# Altium footprint library HamedLib.PcbLib: 221 footprints (part 2 of 14)
Each footprint in its own frame and in the unit in brackets; x right, y up, seen from the top. Pads: shape width x height; smd on the part's side, far side on the other; paste and mask are expansions set on the pad; w line width, h text height; cw(c..) or ccw(c..) is an arc to the next point about the centre after c.
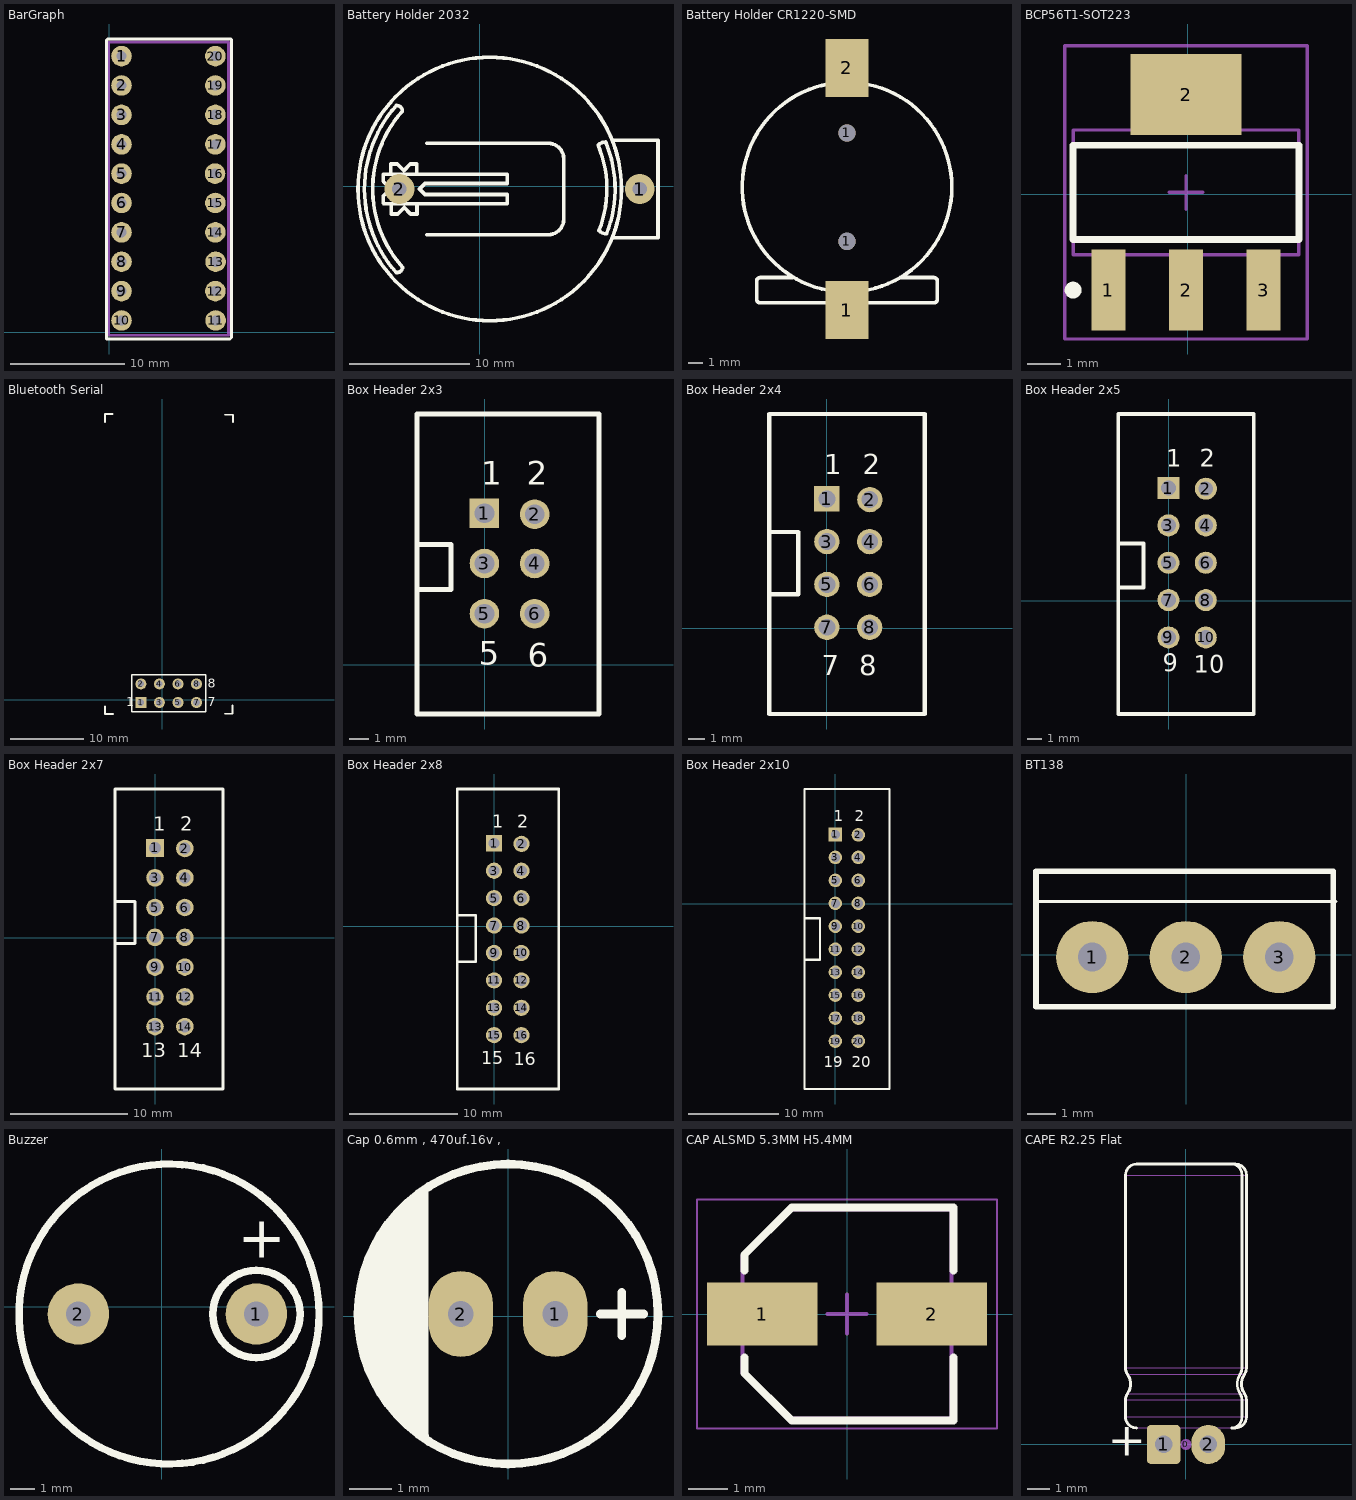
[diagram p1: the footprints below, top view; thin cyan lines are the x and y axes]

## BarGraph [mm] "LED Bar Graph"
height 10
pads (20):
  round 1.8 hole 0.9: 1(1.092,24.232) 2(1.092,21.655) 3(1.092,19.078) 4(1.092,16.485) 5(1.092,13.925) 6(1.092,11.348) 7(1.092,8.771) 8(1.092,6.195) 9(1.092,3.618) 10(1.092,1.041) 11(9.347,1.041) 12(9.322,3.618) 13(9.347,6.195) 14(9.322,8.771) 15(9.322,11.348) 16(9.296,13.925) 17(9.322,16.485) 18(9.322,19.078) 19(9.322,21.655) 20(9.322,24.232)
Top Overlay:
  lines w0.254: -0.229,-0.584 10.617,-0.584 10.744,-0.457 10.744,25.679 10.693,25.73 -0.127,25.73 -0.229,25.629 -0.229,-0.584
Mechanical 1:
  lines w0.254: -0.025,-0.254 -0.025,25.476 10.49,25.476 10.49,-0.254 -0.025,-0.254
3D body "BarGraph.STEP": height 10, standoff -3.2, extent 0.127,-0.125 10.327,25.375

## Battery Holder 2032 [mm]
pads (2):
  round 2.5 hole 1.2: 1(13.36,-0.229) 2(-6.706,-0.229)
Top Overlay:
  circle w0.305: c0.836,-0.229 r11
  lines w0.3: -6.969,6.74 ccw(c0.838,-0.229) -6.957,-7.211 ; -6.459,6.281 ccw(c0.838,-0.229) -6.447,-6.752 ; 9.881,3.429 cw(c1.168,-0.229) 9.954,-3.707 ; 10.509,3.696 cw(c1.168,-0.229) 10.584,-3.97
  lines w0.305: -7.417,1.041 -7.417,1.854 -6.877,1.854 -6.344,1.321 -6.331,1.321 -5.798,1.854 -5.258,1.854 -5.258,1.016 ; -7.391,-1.473 -7.391,-2.311 -6.852,-2.311 -6.312,-1.772 -5.772,-2.311 -5.232,-2.311 -5.232,-1.499 ; -6.918,6.74 cw(c-6.918,6.281) -6.459,6.281 ; -6.906,-7.211 ccw(c-6.906,-6.752) -6.447,-6.752 ; -4.42,-4.039 5.74,-4.039 ccw(c5.74,-2.769) 7.01,-2.769 7.01,-0.229 7.01,2.311 ccw(c5.74,2.311) 5.74,3.581 -4.42,3.581 ; 9.893,3.441 cw(c10.509,2.825) 10.509,3.696 ; 9.954,-3.707 9.956,-3.71 ccw(c10.584,-3.082) 10.584,-3.97 ; 11.074,-4.293 14.884,-4.293 14.884,3.835 11.074,3.835 ; -8.052,-1.422 -8.052,-0.813 -7.442,-0.203 -8.052,0.406 -8.052,1.016 2.286,1.016 2.286,0.229 -4.572,0.229 -5.029,-0.229 -4.572,-0.686 2.286,-0.686 2.286,-1.473 -8.001,-1.473 -8.052,-1.422
3D body "User Library-CR2032_HOR_HOLD.step": height 8.5, standoff -4, extent -10.009,-11.381 14.491,10.619

## Battery Holder CR1220-SMD [mm]
pads (4):
  rect 3x4 smd: 1(-1123.75,-1221) 2(-1123.75,-1204.25)
  round 1.2 hole 1.2: 1(-1123.75,-1216.25) 1(-1123.75,-1208.75)
Top Overlay:
  circle w0.254: c-1123.75,-1212.5 r7.25
  lines w0.254: -1127.5,-1218.75 -1129.75,-1218.75 ccw(c-1129.75,-1219) -1130,-1219 -1130,-1220.25 ccw(c-1129.75,-1220.25) -1129.75,-1220.5 -1117.75,-1220.5 ccw(c-1117.75,-1220.25) -1117.5,-1220.25 -1117.5,-1219 ccw(c-1117.75,-1219) -1117.75,-1218.75 -1120,-1218.75
3D body "User Library-Battery Holder for CR1220 SMD.step": height 4.53, standoff -0.22, extent -1131.131,-1222.092 -1116.382,-1203.292

## BCP56T1-SOT223 [mm]
pads (4):
  rect 1x2.4 smd: 1(-2.35,-2.85) 2(-0.05,-2.85) 3(2.25,-2.85)
  rect 3.3x2.4 smd: 2(-0.05,2.95)
Top Overlay:
  circle w0.25: c-3.4,-2.85 r0.125
  lines w0.2: -3.4,-1.35 -3.4,1.45 3.3,1.45 3.3,-1.35 -3.4,-1.35
Mechanical 13:
  lines w0.1: -3.4,-1.8 -3.4,1.9 3.3,1.9 3.3,-1.8 -3.4,-1.8
Mechanical 15:
  lines w0.1: -0.55,0.05 0.45,0.05 ; -0.05,-0.45 -0.05,0.55 ; -3.65,-4.3 -3.65,4.4 3.55,4.4 3.55,-4.3 -3.65,-4.3
3D body "TO-223.STEP": height 1.64, standoff -0.04, extent -3.292,-3.44 3.192,3.54

## Bluetooth Serial [mm]
pads (8):
  rect 1.5x1.5 hole 0.9: 1(-2.9,-0.397)
  round 1.5 hole 0.9: 2(-2.9,2.143) 3(-0.36,-0.397) 4(-0.36,2.143) 5(2.18,-0.397) 6(2.18,2.143) 7(4.72,-0.397) 8(4.72,2.143)
Top Overlay:
  lines w0.2: -4.17,-1.667 -4.17,3.413 5.99,3.413 5.99,-1.667 -4.17,-1.667
  lines w0.254: -7.825,-0.95 -7.825,-1.975 -6.7,-1.975 ; -7.8,38 -7.8,39.125 -6.775,39.125 ; 8.6,39.025 9.725,39.025 9.725,38 ; 8.625,-1.95 9.65,-1.95 9.65,-0.825
  text "8" at 6.244,1.635 h1.27
  text "7" at 6.244,-0.905 h1.27
  text "1" at -4.932,-0.905 h1.27
3D body "HC-05_Module.step": height 8.5, standoff 3.97, extent -7.725,-1.975 9.6,38.95
3D body: height 6, standoff 0, extent 4.353,1.851 5.15,2.649
3D body: height 6, standoff 0, extent 1.778,1.851 2.575,2.649
3D body: height 6, standoff 0, extent -0.647,1.876 0.15,2.674
3D body: height 6, standoff 0, extent -3.322,1.801 -2.525,2.599
3D body: height 6, standoff 0, extent 4.328,-0.724 5.125,0.074
3D body: height 6, standoff 0, extent 1.728,-0.674 2.525,0.124
3D body: height 6, standoff 0, extent -0.722,-0.674 0.075,0.124
3D body: height 6, standoff 0, extent -3.247,-0.749 -2.45,0.049

## Box Header 2x3 [mm]
height 8.8
pads (6):
  rect 1.5x1.5 hole 1: 1(-0.006,7.666)
  round 1.5 hole 1: 2(2.54,7.62) 3(-0.006,5.126) 4(2.534,5.126) 5(-0.006,2.586) 6(2.534,2.586)
Top Overlay:
  lines w0.254: -3.275,3.8 -1.7,3.8 -1.7,6.1 -3.275,6.1 ; -3.425,-2.5 -3.425,6.914 -3.425,12.7 5.8,12.7 5.8,-2.5 -3.425,-2.5
  text "6" at 2.2,-0.1 h1.2
  text "5" at -0.3,0 h1.2
  text "2" at 2.134,9.126 h1.2
  text "1" at -0.166,9.126 h1.2
3D body "BoxHeader 2x3.stp": height 7.42, standoff -4.68, extent -3.35,-2.5 5.75,12.78

## Box Header 2x4 [mm]
height 8.8
pads (8):
  rect 1.5x1.5 hole 1: 1(-0.006,7.666)
  round 1.5 hole 1: 2(2.54,7.62) 3(-0.006,5.126) 4(2.534,5.126) 5(-0.006,2.586) 6(2.534,2.586) 7(-0.006,0.046) 8(2.534,0.046)
Top Overlay:
  lines w0.254: -3.275,2 -1.7,2 -1.7,5.7 -3.275,5.7 ; -3.425,-5.1 5.8,-5.1 5.8,12.7 -3.425,12.7 -3.425,6.914 -3.425,-5.1
  text "1" at -0.166,9.126 h1.2
  text "2" at 2.134,9.126 h1.2
  text "7" at -0.3,-2.8 h1.2
  text "8" at 1.9,-2.8 h1.2
3D body "BoxHeader 2x4.stp": height 7.42, standoff -4.68, extent -3.3,-5.21 5.8,12.61

## Box Header 2x5 [mm]
height 8.8
pads (10):
  rect 1.5x1.5 hole 1: 1(-0.006,7.666)
  round 1.5 hole 1: 2(2.54,7.62) 3(-0.006,5.126) 4(2.534,5.126) 5(-0.006,2.586) 6(2.534,2.586) 7(-0.006,0.046) 8(2.534,0.046) 9(-0.006,-2.494) 10(2.534,-2.494)
Top Overlay:
  lines w0.254: -3.275,0.9 -1.7,0.9 -1.7,3.9 -3.275,3.9 ; -3.425,-7.7 -3.425,6.914 -3.425,12.7 5.8,12.7 5.8,-7.7 -3.425,-7.7
  text "10" at 1.7,-4.9 h1.2
  text "9" at -0.4,-4.8 h1.2
  text "2" at 2.134,9.126 h1.2
  text "1" at -0.166,9.126 h1.2
3D body "BoxHeader 2x5.stp": height 9.43, standoff -2.68, extent -3.4,-7.7 5.7,12.66

## Box Header 2x7 [mm]
height 8.8
pads (14):
  rect 1.5x1.5 hole 1: 1(-0.006,7.666)
  round 1.5 hole 1: 2(2.54,7.62) 3(-0.006,5.126) 4(2.534,5.126) 5(-0.006,2.586) 6(2.534,2.586) 7(-0.006,0.046) 8(2.534,0.046) 9(-0.006,-2.494) 10(2.534,-2.494) 11(-0.006,-5.034) 12(2.534,-5.034) 13(-0.006,-7.574) 14(2.534,-7.574)
Top Overlay:
  lines w0.254: -3.275,-0.5 -1.7,-0.5 -1.7,3.1 -3.275,3.1 ; -3.425,-12.9 -3.425,6.914 -3.425,12.7 5.8,12.7 5.8,-12.9 -3.425,-12.9
  text "14" at 1.9,-10.2 h1.2
  text "13" at -1.2,-10.2 h1.2
  text "2" at 2.134,9.126 h1.2
  text "1" at -0.166,9.126 h1.2
3D body "BoxHeader 2x7.stp": height 7.42, standoff -4.68, extent -3.35,-12.9 5.75,12.54

## Box Header 2x8 [mm]
height 8.8
pads (16):
  rect 1.5x1.5 hole 1: 1(-0.006,7.666)
  round 1.5 hole 1: 2(2.54,7.62) 3(-0.006,5.126) 4(2.534,5.126) 5(-0.006,2.586) 6(2.534,2.586) 7(-0.006,0.046) 8(2.534,0.046) 9(-0.006,-2.494) 10(2.534,-2.494) 11(-0.006,-5.034) 12(2.534,-5.034) 13(-0.006,-7.574) 14(2.534,-7.574) 15(-0.006,-10.114) 16(2.534,-10.114)
Top Overlay:
  lines w0.254: -3.275,-3.3 -1.7,-3.3 -1.7,1 -3.275,1 ; -3.425,-15.1 6,-15.1 6,12.7 -3.425,12.7 -3.425,6.914 -3.425,-15.1
  text "1" at -0.166,9.126 h1.2
  text "2" at 2.134,9.126 h1.2
  text "15" at -1.2,-12.8 h1.2
  text "16" at 1.8,-12.9 h1.2
3D body "BoxHeader 2x8.stp": height 8.42, standoff -3.68, extent -3.25,-15.1 5.85,12.88

## Box Header 2x10 [mm]
height 8.8
pads (20):
  rect 1.5x1.5 hole 1: 1(-0.006,7.666)
  round 1.5 hole 1: 2(2.54,7.62) 3(-0.006,5.126) 4(2.534,5.126) 5(-0.006,2.586) 6(2.534,2.586) 7(-0.006,0.046) 8(2.534,0.046) 9(-0.006,-2.494) 10(2.534,-2.494) 11(-0.006,-5.034) 12(2.534,-5.034) 13(-0.006,-7.574) 14(2.534,-7.574) 15(-0.006,-10.114) 16(2.534,-10.114) 17(-0.006,-12.654) 18(2.534,-12.654) 19(-0.006,-15.194) 20(2.534,-15.194)
Top Overlay:
  lines w0.254: -3.275,-6.2 -1.7,-6.2 -1.7,-1.6 -3.275,-1.6 ; -3.425,-20.5 -3.425,6.914 -3.425,12.7 6,12.7 6,-20.5 -3.425,-20.5
  text "20" at 1.8,-18.1 h1.2
  text "19" at -1.3,-18.1 h1.2
  text "2" at 2.134,9.126 h1.2
  text "1" at -0.166,9.126 h1.2
3D body "BoxHeader 2x10.stp": height 7.42, standoff -4.68, extent -3.1,-20.43 6,12.63

## BT138 [mm]
pads (3):
  round 2.5 hole 1: 1(-3.25,-0.075) 2(-0.012,-0.075) 3(3.227,-0.075)
Top Overlay:
  lines w0.1: -5.13,1.849 5.195,1.849
  lines w0.2: -5.2,-1.8 5.1,-1.8 5.1,2.9 -5.2,2.9 -5.2,-1.8
3D body "User Library-TO220-AB Full.step": height 20.95, standoff -8.08, extent -4.98,-1.68 4.92,2.778

## Buzzer [mm] "Magnetic Transducer"
height 10
pads (2):
  round 2.5 hole 1: 1(3.859,-0.297) 2(-3.38,-0.297)
Top Overlay:
  circle w0.3: c0.303,-0.297 r6.1
  circle w0.305: c3.859,-0.297 r1.778
  text "+" at 3.097,1.989 h1.7
3D body "Buzzer Magnetic.STEP": height 6.98, standoff -6.1, extent -5.668,-6.387 6.168,5.45

## Cap 0.6mm , 470uf.16v , [mm]
height 6.8
pads (2):
  oval 1.5x2 hole 0.6: 1(1.1,0.051) 2(-1.1,0.051)
Top Overlay:
  circle w0.2: c0,0.051 r3.5
  lines w0.2: -3.34,-0.969 -3.34,1.011 ; -3.17,-1.399 -3.17,1.521 ; -3,1.851 -3,-1.739 -2.99,-1.749 ; 2.15,0.051 3.166,0.051 ; 2.658,-0.457 2.658,0.559
  lines w0.254: -2.81,-1.959 -2.81,2.081 ; -2.59,-2.239 -2.59,2.351 -2.58,2.361 ; -2.37,-2.459 -2.37,2.571 -2.36,2.581 ; -2.2,-2.619 -2.2,2.641 ; -1.98,2.891 -1.98,-2.789 -1.97,-2.799 ; -2.81,2.081 -2.81,2.081

## CAP ALSMD 5.3MM H5.4MM [mm] "Aluminum Electrolytic Capacitor, Body 5.30x5.30x5.40mm, IPC Low Density"
height 5.4
pads (2):
  rect 2.8x1.6 smd: 1(-2.15,0) 2(2.15,0)
Top Overlay:
  lines w0.2: -2.6,-1.1 -2.6,-1.5 -1.4,-2.7 2.7,-2.7 2.7,-1.1 ; -2.6,1.1 -2.6,1.5 -1.4,2.7 2.7,2.7 2.7,1.1
Mechanical 13:
  lines w0.1: -2.65,-1.5 -2.65,1.475 -1.475,2.65 2.65,2.65 2.65,-2.65 -1.5,-2.65 -2.65,-1.5
Mechanical 15:
  lines w0.05: -3.8,-2.9 -3.8,2.9 3.8,2.9 3.8,-2.9 -3.8,-2.9
  lines w0.1: -0.5,0 0.5,0 ; 0,-0.5 0,0.5
3D body "CAP ALSMD - 5.3 x 5.3 x 5.4.step": height 5.4, standoff 0, extent -2.95,-2.7 2.95,2.7

## CAPE R2.25 Flat [mil]
height 216.54
pads (3):
  round 20 on Mech15: 0(0,0)
  rrect25% 60x70 hole 31.5: 1(-40,0)
  oval 60x70 hole 31.5: 2(40,0)
Top Overlay:
  lines w5: -88.58,29.53 cw(c-88.58,49.25) -108.31,49.25 -108.31,79.64 cw(c-88.58,79.64) -104.79,90.88 ccw(c-129.92,108.31) -104.79,125.74 cw(c-88.58,136.98) -108.31,136.98 -108.31,482.32 cw(c-88.58,482.32) -88.58,502.05 81.84,502.05 cw(c81.06,483.05) 100.06,482.32 100.06,136.98 cw(c79.2,136.92) 96.81,125.74 ccw(c124.34,108.31) 96.81,90.88 cw(c79.2,79.7) 100.06,79.64 100.06,49.25 cw(c81.06,48.53) 81.84,29.53 ; 82.99,29.57 88.58,29.57 ccw(c88.58,49.25) 108.27,49.25 108.27,79.64 ccw(c88.58,79.64) 104.76,90.86 cw(c129.92,108.31) 104.76,125.76 ccw(c88.58,136.98) 108.27,136.98 108.27,482.32 ccw(c88.58,482.32) 88.58,502.01 82.99,502.01
  text "+" at -140,-20 h60
Mechanical 13:
  lines w1.97: -49.21,19.68 -29.53,19.68 ; -49.21,29.53 -49.21,0 ccw(c-39.37,0) -29.53,0 -29.53,29.53 ; 29.53,19.68 49.21,19.68 ; 29.53,29.53 29.53,0 ccw(c39.37,0) 49.21,0 49.21,29.53 ; 82.99,29.57 88.58,29.57 ccw(c88.58,49.25) 108.27,49.25 ; 82.99,502.01 88.58,502.01 cw(c88.58,482.32) 108.27,482.32 ; -108.31,49.25 ccw(c-88.58,49.25) -88.58,29.53 81.84,29.53 ccw(c81.06,48.53) 100.06,49.25 100.06,79.64 ccw(c79.2,79.7) 96.81,90.88 ; -108.31,49.25 108.27,49.25 ; -108.31,49.25 -108.31,79.64 ; -108.31,79.64 cw(c-88.58,79.64) -104.79,90.88 ; -108.31,79.64 108.27,79.64 ; -108.31,136.98 ccw(c-88.58,136.98) -104.79,125.74 ; -108.31,136.98 108.27,136.98 ; -108.31,136.98 -108.31,482.32 ; -108.31,482.32 cw(c-88.58,482.32) -88.58,502.05 81.84,502.05 cw(c81.06,483.05) 100.06,482.32 100.06,136.98 cw(c79.2,136.92) 96.81,125.74 ; -108.31,482.32 108.27,482.32 ; -104.79,90.88 ccw(c-129.92,108.31) -104.79,125.74 ; -104.79,90.88 96.81,90.88 ; -104.79,125.74 96.81,125.74 ; 96.81,90.88 cw(c124.34,108.31) 96.81,125.74 ; 96.81,90.88 104.76,90.86 ; 96.81,125.74 104.76,125.76 ; 104.76,90.86 cw(c129.92,108.31) 104.76,125.76 ; 104.76,90.86 cw(c88.58,79.64) 108.27,79.64 ; 104.76,125.76 ccw(c88.58,136.98) 108.27,136.98 ; 108.27,49.25 108.27,79.64 ; 108.27,136.98 108.27,482.32
3D body "CAPAE200P550X1200_FLAT1.STEP": height 215.69, standoff -70, extent -107.37,-9.82 107.35,502.05